# Altium footprint library ST封装.PcbLib: 1336 footprints (part 54 of 109)
Each footprint in its own frame and in the unit in brackets; x right, y up, seen from the top. Pads: shape width x height; smd on the part's side, far side on the other; paste and mask are expansions set on the pad; w line width, h text height; cw(c..) or ccw(c..) is an arc to the next point about the centre after c.
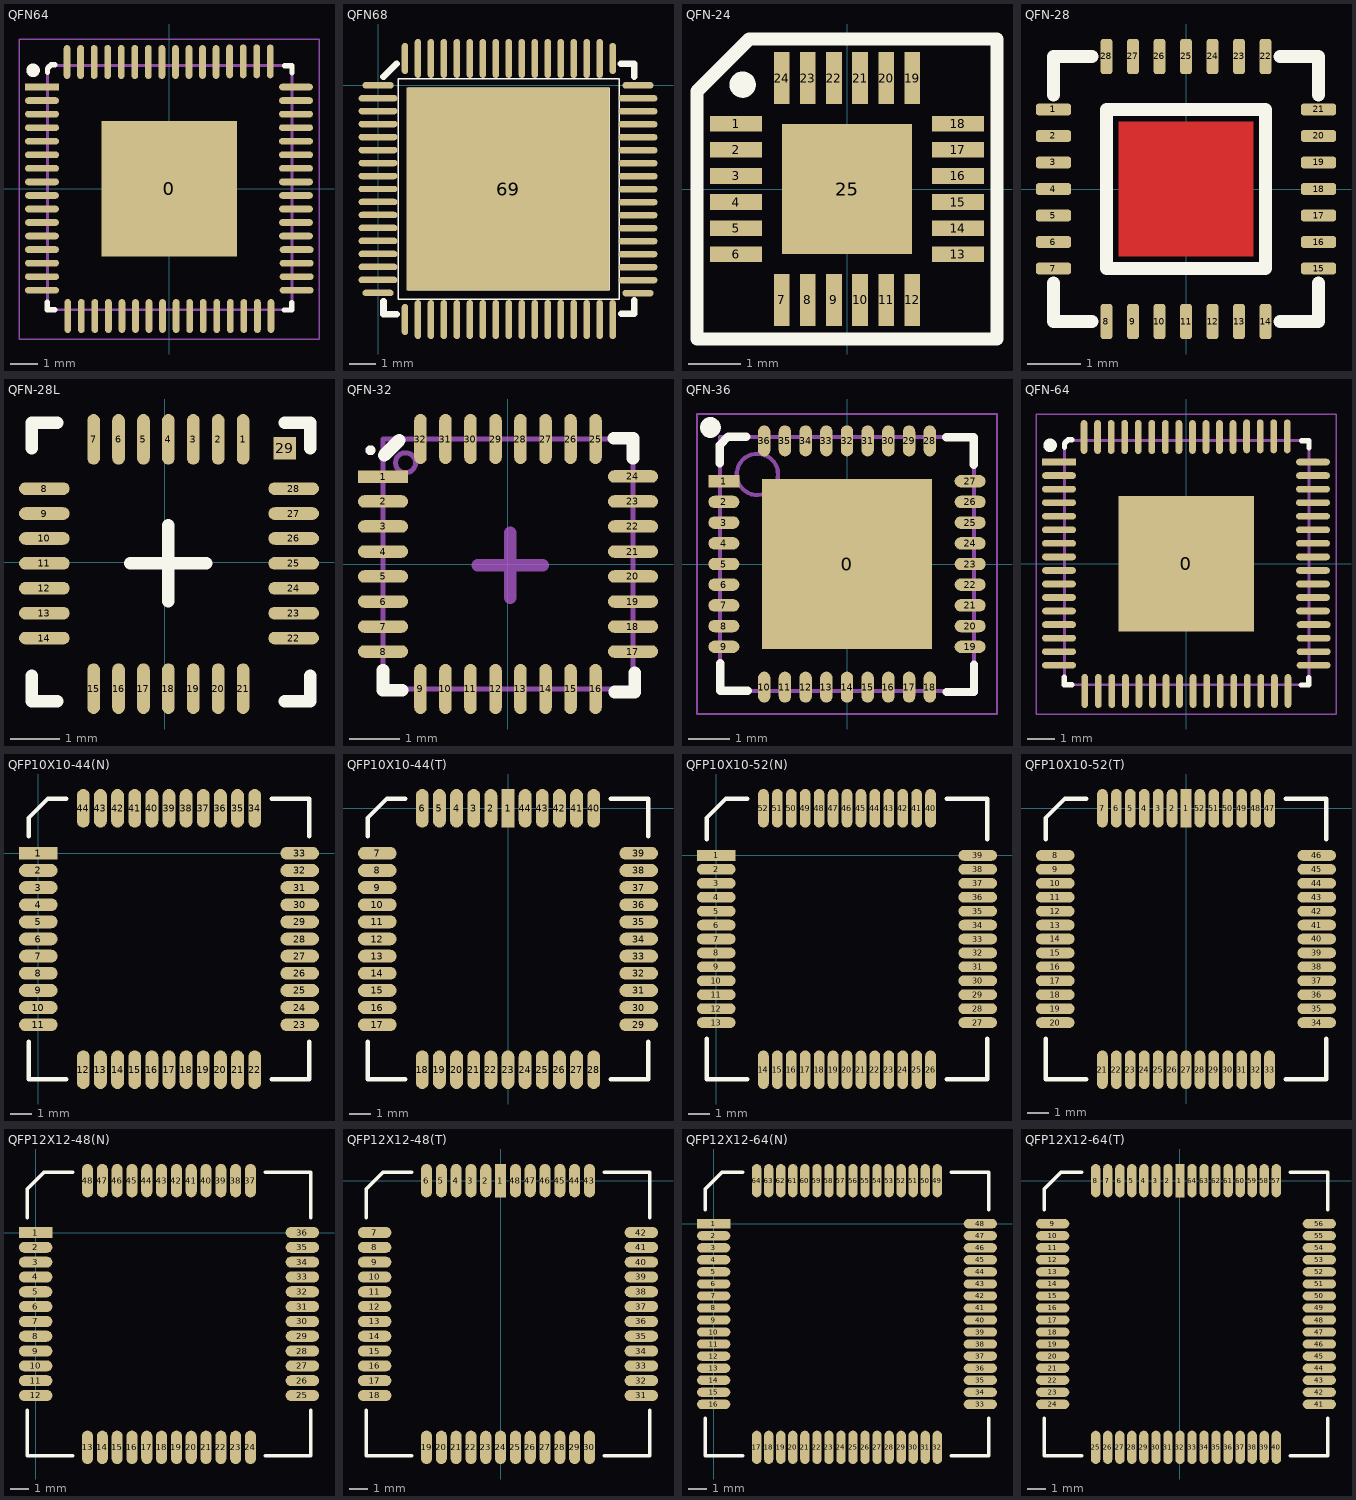
[diagram p53: the footprints below, top view; thin cyan lines are the x and y axes]

## QFN64 [mm]
pads (65):
  rect 5x5 smd: 0(0,0)
  rect 1.25x0.25 smd: 1(-4.7,3.75)
  oval 1.25x0.25 smd: 2(-4.7,3.25) 3(-4.7,2.75) 4(-4.7,2.25) 5(-4.7,1.75) 6(-4.7,1.25) 7(-4.7,0.75) 8(-4.7,0.25) 9(-4.7,-0.25) 10(-4.7,-0.75) 11(-4.7,-1.25) 12(-4.7,-1.75) 13(-4.7,-2.25) 14(-4.7,-2.75) 15(-4.7,-3.25) 16(-4.7,-3.75) 33(4.7,-3.75) 34(4.7,-3.25) 35(4.7,-2.75) 36(4.7,-2.25) 37(4.675,-1.75) 38(4.675,-1.25) 39(4.675,-0.75) 40(4.675,-0.25) 41(4.675,0.25) 42(4.675,0.75) 43(4.675,1.25) 44(4.675,1.75) 45(4.675,2.25) 46(4.675,2.75) 47(4.675,3.25) 48(4.675,3.75)
  oval 0.25x1.25 smd: 17(-3.75,-4.7) 18(-3.25,-4.7) 19(-2.75,-4.7) 20(-2.25,-4.7) 21(-1.75,-4.7) 22(-1.25,-4.7) 23(-0.75,-4.7) 24(-0.25,-4.7) 25(0.25,-4.7) 26(0.75,-4.7) 27(1.25,-4.7) 28(1.75,-4.7) 29(2.25,-4.7) 30(2.75,-4.7) 31(3.25,-4.7) 32(3.75,-4.7) 49(3.725,4.7) 50(3.225,4.7) 51(2.725,4.7) 52(2.225,4.7) 53(1.725,4.675) 54(1.225,4.675) 55(0.725,4.675) 56(0.225,4.675) 57(-0.275,4.675) 58(-0.775,4.675) 59(-1.275,4.675) 60(-1.775,4.675) 61(-2.275,4.675) 62(-2.775,4.675) 63(-3.275,4.675) 64(-3.775,4.675)
Top Overlay:
  circle w0.25: c-5.029,4.369 r0.125
  lines w0.2: -4.504,-4.194 -4.504,-4.469 -4.229,-4.469 ; -4.498,4.295 -4.498,4.433 -4.361,4.57 -4.223,4.57 ; 4.244,-4.478 4.519,-4.478 4.519,-4.203 ; 4.254,4.545 4.529,4.545 4.529,4.27
Mechanical 13:
  lines w0.1: -4.5,-4.475 -4.5,4.55 4.525,4.55 4.525,-4.475 -4.5,-4.475
Mechanical 15:
  lines w0.05: -5.55,-5.55 -5.55,5.525 5.525,5.525 5.525,-5.55 -5.55,-5.55
  lines w0.1: -0.5,0.009 0.5,0.009 ; 0,-0.491 0,0.509
3D body "User Library-QFN64-2.step": height 0.9, standoff 0, extent -4.5,-4.49 4.54,4.55

## QFN68 [mm]
pads (69):
  oval 1.2x0.25 smd: 1(0,0) 17(-0.003,-7.991) 35(10.005,-8) 51(10.005,0)
  oval 1.5x0.25 smd: 2(0,-0.5) 3(-0.003,-0.991) 4(-0.003,-1.491) 5(-0.003,-1.991) 6(-0.003,-2.491) 7(-0.003,-2.991) 8(-0.003,-3.491) 9(-0.003,-3.991) 10(-0.003,-4.491) 11(-0.003,-4.991) 12(-0.003,-5.491) 13(-0.003,-5.991) 14(-0.003,-6.491) 15(-0.003,-6.991) 16(-0.003,-7.491) 36(10.005,-7.5) 37(10.005,-7) 38(10.005,-6.5) 39(10.005,-6) 40(10.005,-5.5) 41(10.005,-5) 42(10.005,-4.5) 43(10.005,-4.001) 44(10.005,-3.5) 45(10.005,-3) 46(10.005,-2.5) 47(10.005,-2) 48(10.005,-1.5) 49(10.005,-1) 50(10.005,-0.5)
  oval 0.25x1.2 smd: 18(1.032,-9.016) 52(9.032,1.034) 68(1.032,1.034)
  oval 0.25x1.5 smd: 19(1.532,-9.016) 20(2.032,-9.016) 21(2.532,-9.016) 22(3.032,-9.016) 23(3.532,-9.016) 24(4.032,-9.016) 25(4.532,-9.016) 26(5.032,-9.016) 27(5.532,-9.016) 28(6.032,-9.016) 29(6.532,-9.016) 30(7.032,-9.016) 31(7.532,-9.016) 32(8.032,-9.016) 33(8.532,-9.016) 34(9.032,-9.016) 53(8.532,1.034) 54(8.032,1.034) 55(7.532,1.034) 56(7.032,1.034) 57(6.532,1.034) 58(6.032,1.034) 59(5.532,1.034) 60(5.032,1.034) 61(4.532,1.034) 62(4.032,1.034) 63(3.532,1.034) 64(3.032,1.034) 65(2.532,1.034) 66(2.032,1.034) 67(1.532,1.034)
  rect 7.8x7.8 all layers, no hole: 69(5.001,-3.991)
Top Overlay:
  lines w0.051: 9.282,-0.701 9.282,0.259 0.772,0.259 0.772,-8.241 9.282,-8.241 9.282,-0.491
  lines w0.1: 1.182,-7.841 8.882,-7.841 8.882,-0.141 1.182,-0.141 1.182,-7.841
  lines w0.254: 0.207,-8.308 0.207,-8.816 0.715,-8.816 ; 0.207,0.328 0.715,0.836 ; 9.351,0.836 9.859,0.836 9.859,0.328 ; 9.356,-8.79 9.864,-8.79 9.864,-8.282

## QFN-24 [mm]
pads (25):
  rect 1x0.3 smd: 1(-2.125,1.25) 2(-2.125,0.75) 3(-2.125,0.25) 4(-2.125,-0.25) 5(-2.125,-0.75) 6(-2.125,-1.25) 13(2.125,-1.25) 14(2.125,-0.75) 15(2.125,-0.25) 16(2.125,0.25) 17(2.125,0.75) 18(2.125,1.25)
  rect 0.3x1 smd: 7(-1.25,-2.125) 8(-0.75,-2.125) 9(-0.25,-2.125) 10(0.25,-2.125) 11(0.75,-2.125) 12(1.25,-2.125) 19(1.25,2.125) 20(0.75,2.125) 21(0.25,2.125) 22(-0.25,2.125) 23(-0.75,2.125) 24(-1.25,2.125)
  rect 2.5x2.5 smd: 25(0,0)
Top Overlay:
  circle w0.254: c-2,2 r0.125
  lines w0.254: -2.875,-2.875 -2.875,1.25 -2.875,1.875 -1.875,2.875 -1.25,2.875 2.875,2.875 2.875,-2.875 -2.875,-2.875
3D body "User Library-QFN 24 4x4.step": height 0.9, standoff 0, extent -2.002,-2.002 2.002,2.002

## QFN-28 [mm]
pads (28):
  rrect50% 0.66x0.23 smd: 1(-2.5,1.5) 2(-2.5,1) 3(-2.5,0.5) 4(-2.5,0) 5(-2.5,-0.5) 6(-2.5,-1) 7(-2.5,-1.5) 15(2.5,-1.5) 16(2.5,-1) 17(2.5,-0.5) 18(2.5,0) 19(2.5,0.5) 20(2.5,1) 21(2.5,1.5)
  rrect50% 0.23x0.66 smd: 8(-1.5,-2.5) 9(-1,-2.5) 10(-0.5,-2.5) 11(0,-2.5) 12(0.5,-2.5) 13(1,-2.5) 14(1.5,-2.5) 22(1.5,2.5) 23(1,2.5) 24(0.5,2.5) 25(0,2.5) 26(-0.5,2.5) 27(-1,2.5) 28(-1.5,2.5)
Top Layer:
  rectangle: -1.27,-1.27 1.27,1.27
Top Overlay:
  lines w0.254: -2.5,-1.778 -2.5,-2.5 -1.778,-2.5 ; -2.5,1.778 -2.5,2.5 -1.778,2.5 ; 1.778,-2.5 2.5,-2.5 2.5,-1.778 ; 1.778,2.5 2.5,2.5 2.5,1.778 ; -1.5,-1.5 1.5,-1.5 1.5,1.5 -1.5,1.5 -1.5,-1.5
  text "." at -2.794,2.794 h1
3D body "User Library-QFN28-0_5.STEP": height 1, standoff 0, extent -2.5,-2.54 2.5,2.46

## QFN-28L [mil]
pads (29):
  oval 10x40 smd: 1(62.04,97) 2(42.36,97) 3(22.68,97) 4(3,97) 5(-16.68,97) 6(-36.36,97) 7(-56.04,97) 15(-56.04,-100) 16(-36.36,-100) 17(-16.68,-100) 18(3,-100) 19(22.68,-100) 20(42.36,-100) 21(62.04,-100)
  oval 40x10 smd: 8(-95,58.04) 9(-95,38.36) 10(-95,18.68) 11(-95,-1) 12(-95,-20.68) 13(-95,-40.36) 14(-95,-60.04) 22(102,-60.04) 23(102,-40.36) 24(102,-20.68) 25(102,-1) 26(102,18.68) 27(102,38.36) 28(102,58.04)
  rect 18x18 smd: 29(95,90)
Top Overlay:
  lines w10: -105,-90 -105,-110 -85,-110 ; -105,90 -105,110 -85,110 ; -27,-1 33,-1 ; 3,-31 3,29 ; 95,-110 115,-110 115,-90 ; 95,110 115,110 115,90
3D body "User Library-QFN28-0_5.STEP": height 39.37, standoff 0, extent -93.42,-98.42 103.43,98.43

## QFN-32 [mm]
pads (32):
  rect 1x0.25 smd: 1(-2.5,1.75)
  oval 1x0.25 smd: 2(-2.5,1.25) 3(-2.5,0.75) 4(-2.5,0.25) 5(-2.5,-0.25) 6(-2.5,-0.75) 7(-2.5,-1.25) 8(-2.5,-1.75) 17(2.5,-1.75) 18(2.5,-1.25) 19(2.5,-0.75) 20(2.5,-0.25) 21(2.5,0.25) 22(2.5,0.75) 23(2.5,1.25) 24(2.5,1.75)
  oval 0.25x1 smd: 9(-1.75,-2.5) 10(-1.25,-2.5) 11(-0.75,-2.5) 12(-0.25,-2.5) 13(0.25,-2.5) 14(0.75,-2.5) 15(1.25,-2.5) 16(1.75,-2.5) 25(1.75,2.5) 26(1.25,2.5) 27(0.75,2.5) 28(0.25,2.5) 29(-0.25,2.5) 30(-0.75,2.5) 31(-1.25,2.5) 32(-1.75,2.5)
Top Overlay:
  circle w0.1: c-2.75,2.275 r0.05
  lines w0.254: -2.5,-2.525 -2.115,-2.525 ; -2.5,-2.51 -2.5,-2.125 ; -2.475,2.175 -2.175,2.475 ; 2.115,2.515 2.5,2.515 ; 2.135,-2.56 2.52,-2.56 ; 2.5,2.115 2.5,2.5 ; 2.535,-2.56 2.535,-2.175
Mechanical 13:
  circle w0.1: c-2.05,2.025 r0.2
  lines w0.1: -2.5,-2.5 2.5,-2.5 2.5,2.5 -2.5,2.5 -2.5,-2.5
Mechanical 15:
  lines w0.1: -2.5,-2.5 2.5,-2.5 2.5,2.5 -2.5,2.5 -2.5,-2.5
  lines w0.254: -0.606,-0.025 0.694,-0.025 ; 0.044,-0.675 0.044,0.625
3D body "User Library-qfn32-5x5.step": height 0.8, standoff 0, extent -2.51,-2.5 2.51,2.52

## QFN-36 [mm]
height 1
pads (37):
  rect 4.1x4.1 smd: 0(0,0)
  rect 0.75x0.3 smd: 1(-2.975,2)
  oval 0.75x0.3 smd: 2(-2.975,1.5) 3(-2.975,1) 4(-2.975,0.5) 5(-2.975,0) 6(-2.975,-0.5) 7(-2.975,-1) 8(-2.975,-1.5) 9(-2.975,-2) 19(2.975,-2) 20(2.975,-1.5) 21(2.975,-1) 22(2.975,-0.5) 23(2.975,0) 24(2.975,0.5) 25(2.975,1) 26(2.975,1.5) 27(2.975,2)
  oval 0.3x0.75 smd: 10(-2,-2.975) 11(-1.5,-2.975) 12(-1,-2.975) 13(-0.5,-2.975) 14(0,-2.975) 15(0.5,-2.975) 16(1,-2.975) 17(1.5,-2.975) 18(2,-2.975) 28(2,2.975) 29(1.5,2.975) 30(1,2.975) 31(0.5,2.975) 32(0,2.975) 33(-0.5,2.975) 34(-1,2.975) 35(-1.5,2.975) 36(-2,2.975)
Top Overlay:
  circle w0.25: c-3.3,3.3 r0.125
  lines w0.2: -3.075,2.875 -2.872,3.078 -2.437,3.078 ; -3.072,2.437 -3.072,2.872 ; -3.063,-2.398 -3.063,-3.063 -2.398,-3.063 ; 2.397,3.062 3.062,3.062 3.062,2.397 ; 2.403,-3.092 3.068,-3.092 3.068,-2.427
Mechanical 13:
  circle w0.1: c-2.165,2.165 r0.5
  lines w0.1: -3.065,-3.065 3.065,-3.065 3.065,3.065 -3.065,3.065 -3.065,-3.065
Mechanical 15:
  lines w0.05: -3.625,-3.625 3.625,-3.625 3.625,3.625 -3.625,3.625 -3.625,-3.625
  lines w0.1: -0.5,0 0.5,0 ; 0,-0.5 0,0.5
3D body "User Library-QFN36 (6x6).STEP": height 0.9, standoff 0.01, extent -3.102,-3.102 3.103,3.103

## QFN-64 [mm]
pads (65):
  rect 5x5 smd: 0(0,0)
  rect 1.25x0.25 smd: 1(-4.7,3.75)
  oval 1.25x0.25 smd: 2(-4.7,3.25) 3(-4.7,2.75) 4(-4.7,2.25) 5(-4.7,1.75) 6(-4.7,1.25) 7(-4.7,0.75) 8(-4.7,0.25) 9(-4.7,-0.25) 10(-4.7,-0.75) 11(-4.7,-1.25) 12(-4.7,-1.75) 13(-4.7,-2.25) 14(-4.7,-2.75) 15(-4.7,-3.25) 16(-4.7,-3.75) 33(4.7,-3.75) 34(4.7,-3.25) 35(4.7,-2.75) 36(4.7,-2.25) 37(4.675,-1.75) 38(4.675,-1.25) 39(4.675,-0.75) 40(4.675,-0.25) 41(4.675,0.25) 42(4.675,0.75) 43(4.675,1.25) 44(4.675,1.75) 45(4.675,2.25) 46(4.675,2.75) 47(4.675,3.25) 48(4.675,3.75)
  oval 0.25x1.25 smd: 17(-3.75,-4.7) 18(-3.25,-4.7) 19(-2.75,-4.7) 20(-2.25,-4.7) 21(-1.75,-4.7) 22(-1.25,-4.7) 23(-0.75,-4.7) 24(-0.25,-4.7) 25(0.25,-4.7) 26(0.75,-4.7) 27(1.25,-4.7) 28(1.75,-4.7) 29(2.25,-4.7) 30(2.75,-4.7) 31(3.25,-4.7) 32(3.75,-4.7) 49(3.725,4.7) 50(3.225,4.7) 51(2.725,4.7) 52(2.225,4.7) 53(1.725,4.675) 54(1.225,4.675) 55(0.725,4.675) 56(0.225,4.675) 57(-0.275,4.675) 58(-0.775,4.675) 59(-1.275,4.675) 60(-1.775,4.675) 61(-2.275,4.675) 62(-2.775,4.675) 63(-3.275,4.675) 64(-3.775,4.675)
Top Overlay:
  circle w0.25: c-5.029,4.369 r0.125
  lines w0.2: -4.504,-4.194 -4.504,-4.469 -4.229,-4.469 ; -4.498,4.295 -4.498,4.433 -4.361,4.57 -4.223,4.57 ; 4.244,-4.478 4.519,-4.478 4.519,-4.203 ; 4.254,4.545 4.529,4.545 4.529,4.27
Mechanical 13:
  lines w0.1: -4.5,-4.475 -4.5,4.55 4.525,4.55 4.525,-4.475 -4.5,-4.475
Mechanical 15:
  lines w0.05: -5.55,-5.55 -5.55,5.525 5.525,5.525 5.525,-5.55 -5.55,-5.55
  lines w0.1: -0.5,0.009 0.5,0.009 ; 0,-0.491 0,0.509
3D body "User Library-QFN64-2.step": height 0.9, standoff 0, extent -4.5,-4.49 4.54,4.55

## QFP10X10-44(N) [mm]
pads (44):
  rect 1.8x0.6 smd: 1(0,0)
  oval 1.8x0.6 smd: 2(0,-0.8) 3(0,-1.6) 4(0,-2.4) 5(0,-3.2) 6(0,-4) 7(0,-4.8) 8(0,-5.6) 9(0,-6.4) 10(0,-7.2) 11(0,-8) 23(12.2,-8) 24(12.2,-7.2) 25(12.2,-6.4) 26(12.2,-5.6) 27(12.2,-4.8) 28(12.2,-4) 29(12.2,-3.2) 30(12.2,-2.4) 31(12.2,-1.6) 32(12.2,-0.8) 33(12.2,0)
  oval 0.6x1.8 smd: 12(2.1,-10.1) 13(2.9,-10.1) 14(3.7,-10.1) 15(4.5,-10.1) 16(5.3,-10.1) 17(6.1,-10.1) 18(6.9,-10.1) 19(7.7,-10.1) 20(8.5,-10.1) 21(9.3,-10.1) 22(10.1,-10.1) 34(10.1,2.1) 35(9.3,2.1) 36(8.5,2.1) 37(7.7,2.1) 38(6.9,2.1) 39(6.1,2.1) 40(5.3,2.1) 41(4.5,2.1) 42(3.7,2.1) 43(2.9,2.1) 44(2.1,2.1)
Top Overlay:
  lines w0.2: -0.45,-8.8 -0.45,-10.55 1.3,-10.55 ; -0.45,0.8 -0.45,1.65 0.45,2.55 1.3,2.55 ; 10.9,-10.55 12.65,-10.55 12.65,-8.8 ; 10.9,2.55 12.65,2.55 12.65,0.8

## QFP10X10-44(T) [mm]
pads (44):
  rect 0.6x1.8 smd: 1(0,0)
  oval 0.6x1.8 smd: 2(-0.8,0) 3(-1.6,0) 4(-2.4,0) 5(-3.2,0) 6(-4,0) 18(-4,-12.2) 19(-3.2,-12.2) 20(-2.4,-12.2) 21(-1.6,-12.2) 22(-0.8,-12.2) 23(0,-12.2) 24(0.8,-12.2) 25(1.6,-12.2) 26(2.4,-12.2) 27(3.2,-12.2) 28(4,-12.2) 40(4,0) 41(3.2,0) 42(2.4,0) 43(1.6,0) 44(0.8,0)
  oval 1.8x0.6 smd: 7(-6.1,-2.1) 8(-6.1,-2.9) 9(-6.1,-3.7) 10(-6.1,-4.5) 11(-6.1,-5.3) 12(-6.1,-6.1) 13(-6.1,-6.9) 14(-6.1,-7.7) 15(-6.1,-8.5) 16(-6.1,-9.3) 17(-6.1,-10.1) 29(6.1,-10.1) 30(6.1,-9.3) 31(6.1,-8.5) 32(6.1,-7.7) 33(6.1,-6.9) 34(6.1,-6.1) 35(6.1,-5.3) 36(6.1,-4.5) 37(6.1,-3.7) 38(6.1,-2.9) 39(6.1,-2.1)
Top Overlay:
  lines w0.2: -6.55,-10.9 -6.55,-12.65 -4.8,-12.65 ; -6.55,-1.3 -6.55,-0.45 -5.65,0.45 -4.8,0.45 ; 4.8,-12.65 6.55,-12.65 6.55,-10.9 ; 4.8,0.45 6.55,0.45 6.55,-1.3

## QFP10X10-52(N) [mm]
pads (52):
  rect 1.8x0.5 smd: 1(0,0)
  oval 1.8x0.5 smd: 2(0,-0.65) 3(0,-1.3) 4(0,-1.95) 5(0,-2.6) 6(0,-3.25) 7(0,-3.9) 8(0,-4.55) 9(0,-5.2) 10(0,-5.85) 11(0,-6.5) 12(0,-7.15) 13(0,-7.8) 27(12.2,-7.8) 28(12.2,-7.15) 29(12.2,-6.5) 30(12.2,-5.85) 31(12.2,-5.2) 32(12.2,-4.55) 33(12.2,-3.9) 34(12.2,-3.25) 35(12.2,-2.6) 36(12.2,-1.95) 37(12.2,-1.3) 38(12.2,-0.65) 39(12.2,0)
  oval 0.5x1.8 smd: 14(2.2,-10) 15(2.85,-10) 16(3.5,-10) 17(4.15,-10) 18(4.8,-10) 19(5.45,-10) 20(6.1,-10) 21(6.75,-10) 22(7.4,-10) 23(8.05,-10) 24(8.7,-10) 25(9.35,-10) 26(10,-10) 40(10,2.2) 41(9.35,2.2) 42(8.7,2.2) 43(8.05,2.2) 44(7.4,2.2) 45(6.75,2.2) 46(6.1,2.2) 47(5.45,2.2) 48(4.8,2.2) 49(4.15,2.2) 50(3.5,2.2) 51(2.85,2.2) 52(2.2,2.2)
Top Overlay:
  lines w0.2: -0.45,-8.55 -0.45,-10.45 1.45,-10.45 ; -0.45,0.75 -0.45,1.75 0.45,2.65 1.45,2.65 ; 10.75,-10.45 12.65,-10.45 12.65,-8.55 ; 10.75,2.65 12.65,2.65 12.65,0.75

## QFP10X10-52(T) [mm]
pads (52):
  rect 0.5x1.8 smd: 1(0,0)
  oval 0.5x1.8 smd: 2(-0.65,0) 3(-1.3,0) 4(-1.95,0) 5(-2.6,0) 6(-3.25,0) 7(-3.9,0) 21(-3.9,-12.2) 22(-3.25,-12.2) 23(-2.6,-12.2) 24(-1.95,-12.2) 25(-1.3,-12.2) 26(-0.65,-12.2) 27(0,-12.2) 28(0.65,-12.2) 29(1.3,-12.2) 30(1.95,-12.2) 31(2.6,-12.2) 32(3.25,-12.2) 33(3.9,-12.2) 47(3.9,0) 48(3.25,0) 49(2.6,0) 50(1.95,0) 51(1.3,0) 52(0.65,0)
  oval 1.8x0.5 smd: 8(-6.1,-2.2) 9(-6.1,-2.85) 10(-6.1,-3.5) 11(-6.1,-4.15) 12(-6.1,-4.8) 13(-6.1,-5.45) 14(-6.1,-6.1) 15(-6.1,-6.75) 16(-6.1,-7.4) 17(-6.1,-8.05) 18(-6.1,-8.7) 19(-6.1,-9.35) 20(-6.1,-10) 34(6.1,-10) 35(6.1,-9.35) 36(6.1,-8.7) 37(6.1,-8.05) 38(6.1,-7.4) 39(6.1,-6.75) 40(6.1,-6.1) 41(6.1,-5.45) 42(6.1,-4.8) 43(6.1,-4.15) 44(6.1,-3.5) 45(6.1,-2.85) 46(6.1,-2.2)
Top Overlay:
  lines w0.2: -6.55,-10.75 -6.55,-12.65 -4.65,-12.65 ; -6.55,-1.45 -6.55,-0.45 -5.65,0.45 -4.65,0.45 ; 4.65,-12.65 6.55,-12.65 6.55,-10.75 ; 4.65,0.45 6.55,0.45 6.55,-1.45

## QFP12X12-48(N) [mm]
pads (48):
  rect 1.8x0.6 smd: 1(0,0)
  oval 1.8x0.6 smd: 2(0,-0.8) 3(0,-1.6) 4(0,-2.4) 5(0,-3.2) 6(0,-4) 7(0,-4.8) 8(0,-5.6) 9(0,-6.4) 10(0,-7.2) 11(0,-8) 12(0,-8.8) 25(14.4,-8.8) 26(14.4,-8) 27(14.4,-7.2) 28(14.4,-6.4) 29(14.4,-5.6) 30(14.4,-4.8) 31(14.4,-4) 32(14.4,-3.2) 33(14.4,-2.4) 34(14.4,-1.6) 35(14.4,-0.8) 36(14.4,0)
  oval 0.6x1.8 smd: 13(2.8,-11.6) 14(3.6,-11.6) 15(4.4,-11.6) 16(5.2,-11.6) 17(6,-11.6) 18(6.8,-11.6) 19(7.6,-11.6) 20(8.4,-11.6) 21(9.2,-11.6) 22(10,-11.6) 23(10.8,-11.6) 24(11.6,-11.6) 37(11.6,2.8) 38(10.8,2.8) 39(10,2.8) 40(9.2,2.8) 41(8.4,2.8) 42(7.6,2.8) 43(6.8,2.8) 44(6,2.8) 45(5.2,2.8) 46(4.4,2.8) 47(3.6,2.8) 48(2.8,2.8)
Top Overlay:
  lines w0.2: -0.45,-9.6 -0.45,-12.05 2,-12.05 ; -0.45,0.8 -0.45,2.35 0.45,3.25 2,3.25 ; 12.4,-12.05 14.85,-12.05 14.85,-9.6 ; 12.4,3.25 14.85,3.25 14.85,0.8

## QFP12X12-48(T) [mm]
pads (48):
  rect 0.6x1.8 smd: 1(0,0)
  oval 0.6x1.8 smd: 2(-0.8,0) 3(-1.6,0) 4(-2.4,0) 5(-3.2,0) 6(-4,0) 19(-4,-14.4) 20(-3.2,-14.4) 21(-2.4,-14.4) 22(-1.6,-14.4) 23(-0.8,-14.4) 24(0,-14.4) 25(0.8,-14.4) 26(1.6,-14.4) 27(2.4,-14.4) 28(3.2,-14.4) 29(4,-14.4) 30(4.8,-14.4) 43(4.8,0) 44(4,0) 45(3.2,0) 46(2.4,0) 47(1.6,0) 48(0.8,0)
  oval 1.8x0.6 smd: 7(-6.8,-2.8) 8(-6.8,-3.6) 9(-6.8,-4.4) 10(-6.8,-5.2) 11(-6.8,-6) 12(-6.8,-6.8) 13(-6.8,-7.6) 14(-6.8,-8.4) 15(-6.8,-9.2) 16(-6.8,-10) 17(-6.8,-10.8) 18(-6.8,-11.6) 31(7.6,-11.6) 32(7.6,-10.8) 33(7.6,-10) 34(7.6,-9.2) 35(7.6,-8.4) 36(7.6,-7.6) 37(7.6,-6.8) 38(7.6,-6) 39(7.6,-5.2) 40(7.6,-4.4) 41(7.6,-3.6) 42(7.6,-2.8)
Top Overlay:
  lines w0.2: -7.25,-12.4 -7.25,-14.85 -4.8,-14.85 ; -7.25,-2 -7.25,-0.45 -6.35,0.45 -4.8,0.45 ; 5.6,-14.85 8.05,-14.85 8.05,-12.4 ; 5.6,0.45 8.05,0.45 8.05,-2

## QFP12X12-64(N) [mm]
pads (64):
  rect 1.8x0.5 smd: 1(0,0)
  oval 1.8x0.5 smd: 2(0,-0.65) 3(0,-1.3) 4(0,-1.95) 5(0,-2.6) 6(0,-3.25) 7(0,-3.9) 8(0,-4.55) 9(0,-5.2) 10(0,-5.85) 11(0,-6.5) 12(0,-7.15) 13(0,-7.8) 14(0,-8.45) 15(0,-9.1) 16(0,-9.75) 33(14.4,-9.75) 34(14.4,-9.1) 35(14.4,-8.45) 36(14.4,-7.8) 37(14.4,-7.15) 38(14.4,-6.5) 39(14.4,-5.85) 40(14.4,-5.2) 41(14.4,-4.55) 42(14.4,-3.9) 43(14.4,-3.25) 44(14.4,-2.6) 45(14.4,-1.95) 46(14.4,-1.3) 47(14.4,-0.65) 48(14.4,0)
  oval 0.5x1.8 smd: 17(2.325,-12.075) 18(2.975,-12.075) 19(3.625,-12.075) 20(4.275,-12.075) 21(4.925,-12.075) 22(5.575,-12.075) 23(6.225,-12.075) 24(6.875,-12.075) 25(7.525,-12.075) 26(8.175,-12.075) 27(8.825,-12.075) 28(9.475,-12.075) 29(10.125,-12.075) 30(10.775,-12.075) 31(11.425,-12.075) 32(12.075,-12.075) 49(12.075,2.325) 50(11.425,2.325) 51(10.775,2.325) 52(10.125,2.325) 53(9.475,2.325) 54(8.825,2.325) 55(8.175,2.325) 56(7.525,2.325) 57(6.875,2.325) 58(6.225,2.325) 59(5.575,2.325) 60(4.925,2.325) 61(4.275,2.325) 62(3.625,2.325) 63(2.975,2.325) 64(2.325,2.325)
Top Overlay:
  lines w0.2: -0.45,-10.5 -0.45,-12.525 1.575,-12.525 ; -0.45,0.75 -0.45,1.875 0.45,2.775 1.575,2.775 ; 12.825,-12.525 14.85,-12.525 14.85,-10.5 ; 12.825,2.775 14.85,2.775 14.85,0.75

## QFP12X12-64(T) [mm]
pads (64):
  rect 0.5x1.8 smd: 1(0,0)
  oval 0.5x1.8 smd: 2(-0.65,0) 3(-1.3,0) 4(-1.95,0) 5(-2.6,0) 6(-3.25,0) 7(-3.9,0) 8(-4.55,0) 25(-4.55,-14.4) 26(-3.9,-14.4) 27(-3.25,-14.4) 28(-2.6,-14.4) 29(-1.95,-14.4) 30(-1.3,-14.4) 31(-0.65,-14.4) 32(0,-14.4) 33(0.65,-14.4) 34(1.3,-14.4) 35(1.95,-14.4) 36(2.6,-14.4) 37(3.25,-14.4) 38(3.9,-14.4) 39(4.55,-14.4) 40(5.2,-14.4) 57(5.2,0) 58(4.55,0) 59(3.9,0) 60(3.25,0) 61(2.6,0) 62(1.95,0) 63(1.3,0) 64(0.65,0)
  oval 1.8x0.5 smd: 9(-6.875,-2.325) 10(-6.875,-2.975) 11(-6.875,-3.625) 12(-6.875,-4.275) 13(-6.875,-4.925) 14(-6.875,-5.575) 15(-6.875,-6.225) 16(-6.875,-6.875) 17(-6.875,-7.525) 18(-6.875,-8.175) 19(-6.875,-8.825) 20(-6.875,-9.475) 21(-6.875,-10.125) 22(-6.875,-10.775) 23(-6.875,-11.425) 24(-6.875,-12.075) 41(7.525,-12.075) 42(7.525,-11.425) 43(7.525,-10.775) 44(7.525,-10.125) 45(7.525,-9.475) 46(7.525,-8.825) 47(7.525,-8.175) 48(7.525,-7.525) 49(7.525,-6.875) 50(7.525,-6.225) 51(7.525,-5.575) 52(7.525,-4.925) 53(7.525,-4.275) 54(7.525,-3.625) 55(7.525,-2.975) 56(7.525,-2.325)
Top Overlay:
  lines w0.2: -7.325,-12.825 -7.325,-14.85 -5.3,-14.85 ; -7.325,-1.575 -7.325,-0.45 -6.425,0.45 -5.3,0.45 ; 5.95,-14.85 7.975,-14.85 7.975,-12.825 ; 5.95,0.45 7.975,0.45 7.975,-1.575